# Altium footprint library Generic Footprint.PcbLib: 160 footprints (part 17 of 20) (continued)
## Symbol_FCC-Logo-9x6mm_Silkscreen [mm] (continued)
1(6.468,4.97) 1(6.478,4.164) 1(6.478,4.184) 1(6.478,4.939) 1(6.478,5.357) 1(6.478,5.378) 1(6.478,5.388) 1(6.488,4.174) 1(6.488,4.939) 1(6.498,2.073) 1(6.498,2.083) 1(6.498,2.093) 1(6.498,4.939) 1(6.509,1.277) 1(6.509,1.287) 1(6.509,1.298) 1(6.509,1.308) 1(6.509,4.949) 1(6.519,4.154) 1(6.519,4.164) 1(6.519,4.174) 1(6.519,4.939) 1(6.519,4.949) 1(6.519,4.959) 1(6.529,0.9) 1(6.529,2.083) 1(6.529,2.093) 1(6.529,2.103) 1(6.529,2.114) 1(6.539,0.084) 1(6.539,0.094) 1(6.539,2.093) 1(6.539,5.347) 1(6.539,5.378) 1(6.539,6.153) 1(6.539,6.163) 1(6.549,0.074) 1(6.549,4.154) 1(6.549,4.164) 1(6.549,5.367) 1(6.549,6.173) 1(6.56,1.308) 1(6.56,2.124) 1(6.56,4.133) 1(6.57,1.298) 1(6.57,1.318) 1(6.57,4.929) 1(6.58,4.154) 1(6.58,4.949) 1(6.58,5.357) 1(6.59,2.114) 1(6.59,2.134) 1(6.59,4.123) 1(6.59,4.133) 1(6.59,4.143) 1(6.59,5.357) 1(6.6,0.89) 1(6.6,2.114) 1(6.6,5.337) 1(6.611,1.308) 1(6.611,1.318) 1(6.611,1.328) 1(6.611,2.124) 1(6.611,2.144) 1(6.611,4.113) 1(6.611,4.123) 1(6.611,4.133) 1(6.611,4.929) 1(6.621,0.094) 1(6.621,0.104) 1(6.621,1.338) 1(6.621,4.919) 1(6.621,4.939) 1(6.621,6.143) 1(6.621,6.153) 1(6.621,6.163) 1(6.631,0.084) 1(6.631,0.114) 1(6.631,0.91) 1(6.631,2.124) 1(6.631,2.134) 1(6.631,4.103) 1(6.631,4.123) 1(6.631,4.908) 1(6.631,6.132) 1(6.641,0.114) 1(6.641,0.89) 1(6.641,0.9) 1(6.641,2.154) 1(6.651,0.114) 1(6.651,1.318) 1(6.651,1.328) 1(6.651,1.338) 1(6.651,2.134) 1(6.651,2.154) 1(6.651,4.092) 1(6.651,4.898) 1(6.651,4.919) 1(6.651,4.929) 1(6.651,5.347) 1(6.662,1.338) 1(6.662,1.349) 1(6.662,2.144) 1(6.662,2.165) 1(6.662,4.082) 1(6.662,4.103) 1(6.662,5.327) 1(6.662,5.347) 1(6.672,2.144) 1(6.672,2.154) 1(6.672,2.175) 1(6.672,4.103) 1(6.682,0.114) 1(6.682,0.9) 1(6.682,0.92) 1(6.682,1.328) 1(6.682,1.338) 1(6.682,2.165) 1(6.682,2.185) 1(6.682,4.092) 1(6.682,5.347) 1(6.682,6.153) 1(6.692,0.094) 1(6.692,0.104) 1(6.692,0.91) 1(6.692,1.349) 1(6.692,1.359) 1(6.692,2.165) 1(6.692,2.175) 1(6.692,4.072) 1(6.692,4.082) 1(6.692,4.092) 1(6.692,4.908) 1(6.692,5.337) 1(6.692,5.347) 1(6.692,6.122) 1(6.692,6.132) 1(6.692,6.143) 1(6.702,4.888) 1(6.702,4.898) 1(6.702,4.908) 1(6.702,4.919) 1(6.702,5.316) 1(6.713,2.175) 1(6.713,2.185) 1(6.713,2.195) 1(6.723,1.338) 1(6.723,1.359) 1(6.723,2.185) 1(6.723,4.062) 1(6.723,4.072) 1(6.723,4.082) 1(6.733,0.91) 1(6.733,0.92) 1(6.733,0.941) 1(6.733,2.205) 1(6.733,2.216) 1(6.733,4.878) 1(6.733,4.888) 1(6.733,5.337) 1(6.733,6.143) 1(6.743,0.104) 1(6.743,4.052) 1(6.743,4.062) 1(6.743,4.072) 1(6.743,4.898) 1(6.743,5.306) 1(6.743,5.316) 1(6.743,5.327) 1(6.743,6.122) 1(6.753,1.349) 1(6.753,2.226) 1(6.753,4.031) 1(6.753,4.041) 1(6.753,4.052) 1(6.753,4.062) 1(6.753,6.112) 1(6.764,4.041) 1(6.764,4.868) 1(6.764,4.878) 1(6.764,6.132) 1(6.774,0.92) 1(6.774,0.93) 1(6.774,0.941) 1(6.774,0.951) 1(6.774,2.236) 1(6.774,4.021) 1(6.774,4.041) 1(6.774,4.052) 1(6.784,2.236) 1(6.784,2.246) 1(6.784,4.011) 1(6.784,4.868) 1(6.784,4.888) 1(6.784,5.296) 1(6.784,5.306) 1(6.784,5.316) 1(6.784,5.327) 1(6.794,1.359) 1(6.804,0.114) 1(6.804,2.236) 1(6.804,6.102) 1(6.804,6.112) 1(6.815,0.941) 1(6.815,0.951) 1(6.815,0.961) 1(6.815,1.369) 1(6.815,2.246) 1(6.815,2.267) 1(6.815,4.001) 1(6.815,4.878) 1(6.815,6.102) 1(6.825,1.4) 1(6.825,2.246) 1(6.825,2.256) 1(6.825,2.267) 1(6.825,2.277) 1(6.825,3.98) 1(6.825,3.99) 1(6.825,5.286) 1(6.825,5.296) 1(6.825,5.306) 1(6.835,0.951) 1(6.835,1.379) 1(6.835,2.267) 1(6.835,2.277) 1(6.835,2.287) 1(6.835,3.99) 1(6.835,6.102) 1(6.835,6.122) 1(6.845,0.125) 1(6.845,0.145) 1(6.845,0.971) 1(6.845,1.389) 1(6.845,1.4) 1(6.845,1.41) 1(6.845,2.297) 1(6.845,3.97) 1(6.845,3.98) 1(6.845,6.102) 1(6.855,2.277) 1(6.855,3.99) 1(6.855,4.837) 1(6.855,4.857) 1(6.855,4.868) 1(6.855,5.276) 1(6.855,5.286) 1(6.855,5.296) 1(6.866,2.307) 1(6.866,3.96) 1(6.866,3.97) 1(6.866,3.98) 1(6.876,0.981) 1(6.876,1.4) 1(6.876,1.42) 1(6.876,2.318) 1(6.876,3.95) 1(6.876,3.96) 1(6.876,3.97) 1(6.876,4.827) 1(6.876,4.837) 1(6.876,4.847) 1(6.886,0.145) 1(6.886,1.41) 1(6.886,2.318) 1(6.886,2.328) 1(6.886,3.929) 1(6.886,3.939) 1(6.886,3.95) 1(6.886,3.96) 1(6.886,5.255) 1(6.886,5.265) 1(6.886,5.286) 1(6.896,0.135) 1(6.896,0.155) 1(6.896,0.165) 1(6.896,2.328) 1(6.896,2.338) 1(6.896,3.95) 1(6.896,4.817) 1(6.896,4.827) 1(6.896,6.112) 1(6.906,0.992) 1(6.906,1.41) 1(6.906,1.42) 1(6.906,1.43) 1(6.906,2.318) 1(6.906,2.348) 1(6.906,3.919) 1(6.906,4.806) 1(6.906,4.837) 1(6.917,0.981) 1(6.917,1.43) 1(6.917,2.328) 1(6.917,2.338) 1(6.917,2.348) 1(6.917,2.358) 1(6.917,3.909) 1(6.927,0.145) 1(6.927,0.981) 1(6.927,2.338) 1(6.927,2.358) 1(6.927,2.369) 1(6.927,3.899) 1(6.927,3.909) 1(6.927,3.919) 1(6.927,4.827) 1(6.927,5.245) 1(6.927,6.102) 1(6.937,0.155) 1(6.937,0.165) 1(6.937,0.176) 1(6.937,1.002) 1(6.937,1.42) 1(6.937,1.451) 1(6.937,2.348) 1(6.937,2.358) 1(6.937,2.369) 1(6.937,2.379) 1(6.937,3.888) 1(6.937,3.899) 1(6.937,3.919) 1(6.937,4.796) 1(6.937,4.806) 1(6.937,4.817) 1(6.937,6.071) 1(6.947,0.155) 1(6.947,0.165) 1(6.947,0.992) 1(6.947,1.43) 1(6.947,1.451) 1(6.947,2.389) 1(6.947,3.868) 1(6.947,3.878) 1(6.947,3.899) 1(6.947,3.909) 1(6.947,4.806) 1(6.947,5.235) 1(6.947,5.255) 1(6.947,6.092) 1(6.957,0.165) 1(6.957,2.369) 1(6.957,2.379) 1(6.957,2.389) 1(6.957,2.399) 1(6.957,2.409) 1(6.957,3.878) 1(6.957,3.888) 1(6.957,4.786) 1(6.957,4.796) 1(6.957,4.817) 1(6.957,5.255) 1(6.968,0.155) 1(6.968,1.44) 1(6.968,2.379) 1(6.968,2.389) 1(6.968,2.399) 1(6.968,2.42) 1(6.968,3.858) 1(6.968,3.868) 1(6.968,3.888) 1(6.978,0.155) 1(6.978,0.176) 1(6.978,0.992) 1(6.978,1.002) 1(6.978,1.012) 1(6.978,2.399) 1(6.978,2.409) 1(6.978,2.42) 1(6.978,2.43) 1(6.978,3.827) 1(6.978,3.837) 1(6.978,3.848) 1(6.978,3.868) 1(6.978,3.878) 1(6.978,4.776) 1(6.978,5.225) 1(6.978,5.245) 1(6.978,6.061) 1(6.978,6.071) 1(6.978,6.081) 1(6.988,0.165) 1(6.988,0.186) 1(6.988,1.451) 1(6.988,1.471) 1(6.988,2.409) 1(6.988,2.42) 1(6.988,2.43) 1(6.988,2.44) 1(6.988,3.817) 1(6.988,4.786) 1(6.998,1.002) 1(6.998,1.012) 1(6.998,1.022) 1(6.998,4.776) 1(6.998,4.796) 1(6.998,5.235) 1(6.998,5.245) 1(7.008,0.186) 1(7.008,0.196) 1(7.008,1.461) 1(7.008,1.471) 1(7.008,1.481) 1(7.008,3.807) 1(7.008,3.817) 1(7.008,6.051) 1(7.008,6.061) 1(7.008,6.071) 1(7.019,0.176) 1(7.019,1.012) 1(7.019,1.032) 1(7.019,1.491) 1(7.019,4.786) 1(7.019,5.214) 1(7.029,1.022) 1(7.029,1.032) 1(7.029,1.043) 1(7.029,1.471) 1(7.029,1.491) 1(7.029,3.766) 1(7.029,3.776) 1(7.029,3.817) 1(7.029,5.204) 1(7.029,5.225) 1(7.029,5.235) 1(7.039,1.032) 1(7.039,1.481) 1(7.039,1.502) 1(7.039,3.776) 1(7.039,3.797) 1(7.039,4.776) 1(7.039,5.214) 1(7.049,1.022) 1(7.049,1.053) 1(7.049,4.745) 1(7.049,5.194) 1(7.049,5.204) 1(7.049,5.225) 1(7.059,0.186) 1(7.059,0.196) 1(7.059,1.481) 1(7.059,1.491) 1(7.059,1.502) 1(7.059,1.512) 1(7.059,3.786) 1(7.059,4.735) 1(7.059,4.745) 1(7.059,4.755) 1(7.059,4.766) 1(7.059,5.214) 1(7.059,6.041) 1(7.059,6.051) 1(7.059,6.061) 1(7.07,0.186) 1(7.07,6.03) 1(7.08,0.186) 1(7.08,1.063) 1(7.08,1.512) 1(7.08,1.522) 1(7.08,4.725) 1(7.08,4.735) 1(7.08,4.745) 1(7.08,5.184) 1(7.08,5.194) 1(7.08,5.204) 1(7.09,1.502) 1(7.09,6.03) 1(7.09,6.041) 1(7.09,6.051) 1(7.1,1.053) 1(7.1,1.073) 1(7.1,1.522) 1(7.1,1.532) 1(7.1,4.715) 1(7.1,4.725) 1(7.1,4.735) 1(7.1,5.174) 1(7.1,5.194) 1(7.1,6.02) 1(7.11,1.053) 1(7.11,1.512) 1(7.11,1.532) 1(7.11,4.715) 1(7.11,4.725) 1(7.121,0.196) 1(7.121,1.063) 1(7.121,1.083) 1(7.121,4.694) 1(7.121,6.02) 1(7.121,6.041) 1(7.131,0.206) 1(7.131,1.522) 1(7.131,4.694) 1(7.131,4.715) 1(7.131,5.163) 1(7.141,1.063) 1(7.141,1.073) 1(7.141,1.083) 1(7.141,1.094) 1(7.141,1.532) 1(7.141,1.563) 1(7.141,4.684) 1(7.141,5.153) 1(7.141,6.01) 1(7.151,1.542) 1(7.151,4.704) 1(7.151,6.01) 1(7.151,6.03) 1(7.161,0.216) 1(7.161,0.237) 1(7.161,1.073) 1(7.161,1.094) 1(7.161,1.563) 1(7.161,4.684) 1(7.161,5.143) 1(7.172,1.083) 1(7.172,1.104) 1(7.172,1.553) 1(7.172,1.573) 1(7.172,4.674) 1(7.172,4.694) 1(7.182,0.247) 1(7.182,1.583) 1(7.182,4.664) 1(7.182,4.674) 1(7.182,5.133) 1(7.182,5.153) 1(7.192,0.227) 1(7.192,0.237) 1(7.192,1.094) 1(7.192,1.104) 1(7.192,1.114) 1(7.192,1.563) 1(7.192,1.573) 1(7.192,1.593) 1(7.192,4.664) 1(7.192,4.674) 1(7.192,4.684) 1(7.192,5.143) 1(7.192,5.153) 1(7.192,6.02) 1(7.202,1.573) 1(7.202,1.583) 1(7.202,1.604) 1(7.202,4.643) 1(7.202,5.123) 1(7.212,1.104) 1(7.212,1.114) 1(7.212,1.124) 1(7.212,1.583) 1(7.212,1.593) 1(7.212,1.604) 1(7.212,1.614) 1(7.212,5.133) 1(7.212,5.143) 1(7.212,5.979) 1(7.212,5.99) 1(7.212,6.01) 1(7.223,0.237) 1(7.223,0.247) 1(7.223,0.257) 1(7.223,4.633) 1(7.223,4.643) 1(7.223,4.653) 1(7.223,4.664) 1(7.233,0.267) 1(7.233,1.114) 1(7.233,1.124) 1(7.233,1.134) 1(7.233,1.145) 1(7.233,1.593) 1(7.233,1.614) 1(7.233,4.623) 1(7.233,4.633) 1(7.233,5.102) 1(7.233,5.123) 1(7.233,5.133) 1(7.243,0.247) 1(7.243,0.257) 1(7.243,1.124) 1(7.243,1.604) 1(7.243,1.624) 1(7.243,4.623) 1(7.243,4.643) 1(7.243,5.979) 1(7.243,5.99) 1(7.243,6) 1(7.253,0.267) 1(7.253,0.278) 1(7.253,1.624) 1(7.253,4.613) 1(7.253,4.633) 1(7.253,5.092) 1(7.253,5.102) 1(7.253,5.123) 1(7.253,5.969) 1(7.263,1.155) 1(7.263,1.614) 1(7.263,1.634) 1(7.263,4.613) 1(7.263,5.112) 1(7.263,5.99) 1(7.274,0.257) 1(7.274,0.278) 1(7.274,1.165) 1(7.274,1.624) 1(7.274,1.634) 1(7.274,1.644) 1(7.274,1.655) 1(7.274,4.623) 1(7.274,5.969) 1(7.284,0.288) 1(7.284,1.634) 1(7.284,1.644) 1(7.284,1.655) 1(7.284,1.665) 1(7.284,4.613) 1(7.284,5.082) 1(7.284,5.102) 1(7.284,5.959) 1(7.284,5.979) 1(7.294,0.267) 1(7.294,1.155) 1(7.294,1.644) 1(7.294,4.602) 1(7.294,5.072) 1(7.304,0.288) 1(7.304,1.165) 1(7.304,1.175) 1(7.304,1.655) 1(7.304,1.665) 1(7.304,1.675) 1(7.304,5.061) 1(7.304,5.949) 1(7.304,5.959) 1(7.304,5.969) 1(7.314,0.298) 1(7.314,1.155) 1(7.314,1.165) 1(7.314,1.185) 1(7.314,4.562) 1(7.314,4.572) 1(7.314,4.592) 1(7.325,1.175) 1(7.325,1.185) 1(7.325,1.196) 1(7.325,1.665) 1(7.325,1.675) 1(7.325,1.685) 1(7.325,4.551) 1(7.325,4.562) 1(7.325,4.572) 1(7.325,4.582) 1(7.335,0.278) 1(7.335,0.298) 1(7.335,1.675) 1(7.335,1.685) 1(7.335,4.551) 1(7.335,4.572) 1(7.335,5.041) 1(7.335,5.051) 1(7.335,5.061) 1(7.335,5.939) 1(7.335,5.949) 1(7.345,1.175) 1(7.345,1.185) 1(7.345,1.196) 1(7.345,1.206) 1(7.345,1.685) 1(7.345,4.531) 1(7.345,4.562) 1(7.345,5.051) 1(7.345,5.061) 1(7.345,5.959) 1(7.355,0.288) 1(7.355,1.695) 1(7.355,4.551) 1(7.355,5.939) 1(7.365,4.521) 1(7.365,5.031) 1(7.365,5.051) 1(7.376,0.298) 1(7.376,1.196) 1(7.376,1.206) 1(7.376,1.216) 1(7.376,1.226) 1(7.376,1.706) 1(7.376,4.521) 1(7.376,4.531) 1(7.376,4.541) 1(7.376,5.021) 1(7.376,5.031) 1(7.376,5.041) 1(7.376,5.949) 1(7.386,0.308) 1(7.386,0.329) 1(7.386,1.206) 1(7.386,1.216) 1(7.386,1.716) 1(7.386,4.531) 1(7.386,5.041) 1(7.386,5.939) 1(7.396,1.216) 1(7.396,1.236) 1(7.396,1.726) 1(7.396,4.521) 1(7.396,5.01) 1(7.396,5.031) 1(7.406,1.247) 1(7.406,1.757) 1(7.406,4.48) 1(7.406,4.49) 1(7.406,5) 1(7.416,0.318) 1(7.416,0.329) 1(7.416,0.339) 1(7.416,1.257) 1(7.416,1.736) 1(7.416,1.746) 1(7.416,1.757) 1(7.416,1.767) 1(7.416,4.47) 1(7.416,4.49) 1(7.416,4.5) 1(7.416,4.511) 1(7.416,4.99) 1(7.416,5.908) 1(7.416,5.928) 1(7.427,1.757) 1(7.427,1.767) 1(7.427,1.777) 1(7.427,4.46) 1(7.427,4.48) 1(7.427,4.49) 1(7.427,5.908) 1(7.437,0.329) 1(7.437,0.339) 1(7.437,0.349) 1(7.437,1.247) 1(7.437,1.267) 1(7.437,1.767) 1(7.437,1.777) 1(7.437,1.787) 1(7.437,4.449) 1(7.437,4.46) 1(7.437,4.47) 1(7.437,4.48) 1(7.437,4.98) 1(7.437,5.898) 1(7.437,5.918) 1(7.447,1.247) 1(7.447,1.257) 1(7.447,1.277) 1(7.447,1.777) 1(7.447,1.787) 1(7.447,2.43) 1(7.447,2.44) 1(7.447,2.45) 1(7.447,4.439) 1(7.447,4.449) 1(7.447,4.47) 1(7.447,4.97) 1(7.457,0.339) 1(7.457,0.349) 1(7.457,0.359) 1(7.457,1.257) 1(7.457,1.267) 1(7.457,4.429) 1(7.457,4.439) 1(7.457,4.46) 1(7.457,5.888) 1(7.457,5.898) 1(7.457,5.908) 1(7.467,0.369) 1(7.467,1.277) 1(7.467,1.287) 1(7.467,1.787) 1(7.467,1.797) 1(7.467,4.429) 1(7.467,4.449) 1(7.467,4.959) 1(7.467,5.877) 1(7.478,0.349) 1(7.478,0.369) 1(7.478,1.267) 1(7.478,1.277) 1(7.478,1.298) 1(7.478,1.808) 1(7.478,1.828) 1(7.478,4.439) 1(7.478,4.949) 1(7.478,5.898) 1(7.488,0.359) 1(7.488,0.38) 1(7.488,1.287) 1(7.488,1.308) 1(7.488,1.818) 1(7.488,1.828) 1(7.488,1.838) 1(7.488,4.398) 1(7.488,4.429) 1(7.488,4.939) 1(7.488,4.949) 1(7.488,4.959) 1(7.488,5.867) 1(7.488,5.877) 1(7.488,5.888) 1(7.498,0.359) 1(7.498,1.287) 1(7.498,1.298) 1(7.498,1.828) 1(7.498,1.838) 1(7.498,1.848) 1(7.498,1.859) 1(7.498,4.388) 1(7.498,4.419) 1(7.498,4.959) 1(7.498,5.888) 1(7.508,0.38) 1(7.508,0.39) 1(7.508,1.318) 1(7.508,1.848) 1(7.508,4.378) 1(7.508,4.398) 1(7.508,4.409) 1(7.508,4.929) 1(7.508,4.939) 1(7.508,4.949) 1(7.508,5.857) 1(7.508,5.867) 1(7.508,5.877) 1(7.518,0.369) 1(7.518,0.39) 1(7.518,1.298) 1(7.518,1.308) 1(7.518,1.838) 1(7.518,1.848) 1(7.518,1.859) 1(7.518,1.869) 1(7.518,1.879) 1(7.518,4.368) 1(7.518,4.388) 1(7.518,4.398) 1(7.518,4.919) 1(7.529,1.308) 1(7.529,1.328) 1(7.529,1.859) 1(7.529,1.869) 1(7.529,4.358) 1(7.529,4.378) 1(7.529,4.388) 1(7.529,4.908) 1(7.529,4.929) 1(7.529,4.939) 1(7.529,5.847) 1(7.529,5.857) 1(7.539,1.338) 1(7.539,1.349) 1(7.539,1.869) 1(7.539,1.879) 1(7.539,1.889) 1(7.539,1.899) 1(7.539,4.358) 1(7.539,4.368) 1(7.539,4.378) 1(7.539,4.898) 1(7.539,4.929) 1(7.539,5.867) 1(7.549,0.38) 1(7.549,1.338) 1(7.549,1.879) 1(7.549,1.889) 1(7.549,1.899) 1(7.549,4.368) 1(7.549,5.847) 1(7.559,1.359) 1(7.559,4.358) 1(7.559,4.888) 1(7.569,0.39) 1(7.569,0.41) 1(7.569,0.42) 1(7.569,1.338) 1(7.569,1.889) 1(7.569,1.899) 1(7.569,1.91) 1(7.569,1.93) 1(7.569,4.347) 1(7.569,4.878) 1(7.569,5.857) 1(7.58,1.369) 1(7.58,1.92) 1(7.58,1.93) 1(7.58,1.94) 1(7.58,1.95) 1(7.58,4.307) 1(7.58,4.327) 1(7.58,4.337) 1(7.58,4.868) 1(7.58,4.888) 1(7.59,0.4) 1(7.59,0.41) 1(7.59,0.42) 1(7.59,0.431) 1(7.59,1.369) 1(7.59,1.379) 1(7.59,1.93) 1(7.59,1.94) 1(7.59,1.961) 1(7.59,1.971) 1(7.59,4.276) 1(7.59,4.286) 1(7.59,4.307) 1(7.59,4.317) 1(7.59,4.878) 1(7.59,4.888) 1(7.59,5.847) 1(7.6,0.41) 1(7.6,1.369) 1(7.6,1.379) 1(7.6,1.389) 1(7.6,1.4) 1(7.6,1.94) 1(7.6,1.95) 1(7.6,1.961) 1(7.6,1.981) 1(7.6,4.286) 1(7.6,4.307) 1(7.6,4.857) 1(7.6,5.816) 1(7.6,5.837) 1(7.61,0.431) 1(7.61,1.379) 1(7.61,1.41) 1(7.61,1.95) 1(7.61,4.266) 1(7.61,4.296) 1(7.61,4.857) 1(7.61,4.878) 1(7.61,5.816) 1(7.62,0.42) 1(7.62,0.441) 1(7.62,1.961) 1(7.62,1.981) 1(7.62,1.991) 1(7.62,4.266) 1(7.62,4.286) 1(7.62,4.837) 1(7.62,4.847) 1(7.62,5.806) 1(7.62,5.826) 1(7.631,1.981) 1(7.631,1.991) 1(7.631,2.001) 1(7.631,2.012) 1(7.631,4.235) 1(7.631,4.266) 1(7.631,4.847) 1(7.631,4.857) 1(7.631,5.796) 1(7.631,5.806) 1(7.641,0.431) 1(7.641,0.441) 1(7.641,0.451) 1(7.641,1.42) 1(7.641,1.991) 1(7.641,2.001) 1(7.641,2.012) 1(7.641,4.235) 1(7.641,4.256) 1(7.641,4.827) 1(7.641,4.837) 1(7.641,4.847) 1(7.641,5.786) 1(7.641,5.796) 1(7.641,5.806) 1(7.641,5.816) 1(7.651,1.43) 1(7.651,2.001) 1(7.651,2.012) 1(7.651,2.022) 1(7.651,2.042) 1(7.651,4.205) 1(7.651,4.225) 1(7.651,4.235) 1(7.651,4.245) 1(7.651,4.806) 1(7.651,4.817) 1(7.651,4.827) 1(7.651,4.837) 1(7.651,5.775) 1(7.661,0.441) 1(7.661,0.451) 1(7.661,0.461) 1(7.661,1.44) 1(7.661,4.194) 1(7.661,4.796) 1(7.661,4.817) 1(7.661,4.827) 1(7.671,0.451) 1(7.671,0.461) 1(7.671,1.43) 1(7.671,1.44) 1(7.671,1.451) 1(7.671,2.032) 1(7.671,2.042) 1(7.671,2.063) 1(7.671,2.073) 1(7.671,4.184) 1(7.671,4.194) 1(7.671,4.205) 1(7.671,4.215) 1(7.671,4.786) 1(7.671,4.806) 1(7.671,4.817) 1(7.671,5.765) 1(7.671,5.786) 1(7.671,5.796) 1(7.682,1.43) 1(7.682,1.44) 1(7.682,1.451) 1(7.682,1.461) 1(7.682,2.042) 1(7.682,2.063) 1(7.682,2.083) 1(7.682,2.093) 1(7.682,4.154) 1(7.682,4.164) 1(7.682,4.174) 1(7.682,4.184) 1(7.682,4.205) 1(7.682,4.776) 1(7.682,4.796) 1(7.682,4.806) 1(7.682,5.775) 1(7.692,1.451) 1(7.692,1.461) 1(7.692,1.471) 1(7.692,2.052) 1(7.692,2.063) 1(7.692,2.073) 1(7.692,2.083) 1(7.692,2.093) 1(7.692,2.103) 1(7.692,4.143) 1(7.692,4.154) 1(7.692,4.164) 1(7.692,4.184) 1(7.692,4.194) 1(7.692,4.786) 1(7.692,4.796) 1(7.692,5.765) 1(7.692,5.786) 1(7.702,0.461) 1(7.702,1.461) 1(7.702,1.481) 1(7.702,2.073) 1(7.702,2.083) 1(7.702,2.093) 1(7.702,2.103) 1(7.702,2.114) 1(7.702,2.124) 1(7.702,4.123) 1(7.702,4.133) 1(7.702,4.154) 1(7.702,4.164) 1(7.702,4.766) 1(7.702,4.776) 1(7.702,4.786) 1(7.702,5.755) 1(7.702,5.775) 1(7.712,0.471) 1(7.712,1.491) 1(7.712,2.103) 1(7.712,4.745) 1(7.712,4.755) 1(7.712,4.766) 1(7.712,4.776) 1(7.712,5.755) 1(7.722,0.492) 1(7.722,1.502) 1(7.722,2.114) 1(7.722,2.124) 1(7.722,2.134) 1(7.722,2.144) 1(7.722,4.103) 1(7.722,4.113) 1(7.722,4.123) 1(7.722,4.735) 1(7.722,4.755) 1(7.722,4.766) 1(7.722,5.765) 1(7.733,0.482) 1(7.733,0.492) 1(7.733,0.502) 1(7.733,1.502) 1(7.733,1.512) 1(7.733,2.114) 1(7.733,2.124) 1(7.733,2.134) 1(7.733,2.144) 1(7.733,2.154) 1(7.733,4.082) 1(7.733,4.092) 1(7.733,4.103) 1(7.733,4.123) 1(7.733,4.745) 1(7.733,4.755) 1(7.743,0.492) 1(7.743,0.502) 1(7.743,0.512) 1(7.743,1.502) 1(7.743,1.512) 1(7.743,1.522) 1(7.743,2.134) 1(7.743,2.144) 1(7.743,4.082) 1(7.743,4.092) 1(7.743,4.725) 1(7.743,4.735) 1(7.743,4.745) 1(7.743,5.755) 1(7.753,0.522) 1(7.753,1.512) 1(7.753,1.522) 1(7.753,1.532) 1(7.753,2.216) 1(7.753,2.226) 1(7.753,4.082) 1(7.753,4.092) 1(7.753,4.103) 1(7.753,4.704) 1(7.753,4.715) 1(7.753,4.725) 1(7.753,4.735) 1(7.753,5.745) 1(7.763,1.532) 1(7.763,1.542) 1(7.763,2.165) 1(7.763,2.185) 1(7.763,4.021) 1(7.763,4.031) 1(7.763,4.062) 1(7.763,4.694) 1(7.763,4.715) 1(7.763,4.725) 1(7.763,5.714) 1(7.773,0.502) 1(7.773,0.512) 1(7.773,0.522) 1(7.773,0.533) 1(7.773,1.522) 1(7.773,1.542) 1(7.773,1.553) 1(7.773,2.175) 1(7.773,2.236) 1(7.773,4.011) 1(7.773,4.041) 1(7.773,4.072) 1(7.773,4.684) 1(7.773,4.704) 1(7.773,4.715) 1(7.773,5.735) 1(7.784,0.512) 1(7.784,0.533) 1(7.784,0.543) 1(7.784,1.532) 1(7.784,1.542) 1(7.784,1.553) 1(7.784,1.563) 1(7.784,2.195) 1(7.784,2.205) 1(7.784,2.246) 1(7.784,2.256) 1(7.784,3.98) 1(7.784,3.99) 1(7.784,4.001) 1(7.784,4.021) 1(7.784,4.052) 1(7.784,4.674) 1(7.784,4.694) 1(7.784,4.704) 1(7.784,5.704) 1(7.784,5.714) 1(7.784,5.724) 1(7.794,0.522) 1(7.794,1.553) 1(7.794,1.563) 1(7.794,1.573) 1(7.794,2.246) 1(7.794,2.256) 1(7.794,2.267) 1(7.794,2.277) 1(7.794,3.97) 1(7.794,3.99) 1(7.794,4.001) 1(7.794,4.021) 1(7.794,4.684) 1(7.794,4.694) 1(7.804,0.543) 1(7.804,0.553) 1(7.804,1.563) 1(7.804,1.583) 1(7.804,2.246) 1(7.804,2.256) 1(7.804,2.277) 1(7.804,2.297) 1(7.804,3.95) 1(7.804,3.97) 1(7.804,3.99) 1(7.804,4.001) 1(7.804,4.664) 1(7.804,4.674) 1(7.804,4.684) 1(7.804,5.694) 1(7.804,5.704) 1(7.804,5.714) 1(7.814,0.533) 1(7.814,1.593) 1(7.814,2.287) 1(7.814,2.297) 1(7.814,3.95) 1(7.814,3.96) 1(7.814,4.643) 1(7.814,4.653) 1(7.814,4.674) 1(7.814,5.684) 1(7.814,5.694) 1(7.814,5.704) 1(7.824,0.553) 1(7.824,1.604) 1(7.824,2.277) 1(7.824,3.97) 1(7.824,4.633) 1(7.824,4.653) 1(7.824,5.673) 1(7.835,0.543) 1(7.835,1.604) 1(7.835,1.614) 1(7.835,2.297) 1(7.835,2.307) 1(7.835,2.369) 1(7.835,2.379) 1(7.835,3.878) 1(7.835,3.929) 1(7.835,3.939) 1(7.835,3.95) 1(7.835,4.623) 1(7.835,4.643) 1(7.835,4.653) 1(7.835,5.684) 1(7.845,1.604) 1(7.845,1.614) 1(7.845,1.624) 1(7.845,2.318) 1(7.845,2.328) 1(7.845,2.338) 1(7.845,2.369) 1(7.845,2.379) 1(7.845,2.399) 1(7.845,3.848) 1(7.845,3.878) 1(7.845,3.919) 1(7.845,4.633) 1(7.845,4.643) 1(7.845,5.673) 1(7.845,5.684) 1(7.845,5.694) 1(7.855,0.553) 1(7.855,1.655) 1(7.855,2.348) 1(7.855,2.358) 1(7.855,2.369) 1(7.855,2.399) 1(7.855,2.409) 1(7.855,2.42) 1(7.855,3.807) 1(7.855,3.817) 1(7.855,3.827) 1(7.855,3.848) 1(7.855,3.878) 1(7.855,3.888) 1(7.855,3.899) 1(7.855,3.909) 1(7.855,4.613) 1(7.855,4.623) 1(7.855,4.633) 1(7.865,0.563) 1(7.865,1.614) 1(7.865,1.634) 1(7.865,1.644) 1(7.865,1.665) 1(7.865,2.379) 1(7.865,2.389) 1(7.865,2.43) 1(7.865,3.837) 1(7.865,3.858) 1(7.865,3.868) 1(7.865,4.602) 1(7.865,4.623) 1(7.875,0.573) 1(7.875,0.594) 1(7.875,1.655) 1(7.875,2.399) 1(7.875,2.42) 1(7.875,2.43) 1(7.875,3.786) 1(7.875,3.797) 1(7.875,3.817) 1(7.875,3.827) 1(7.875,3.848) 1(7.875,4.572) 1(7.875,4.582) 1(7.875,4.592) 1(7.875,5.673) 1(7.886,0.594) 1(7.886,0.604) 1(7.886,1.655) 1(7.886,1.675) 1(7.886,2.42) 1(7.886,2.43) 1(7.886,3.786) 1(7.886,3.797) 1(7.886,3.817) 1(7.886,3.827) 1(7.886,4.582) 1(7.886,5.643) 1(7.886,5.663) 1(7.896,0.584) 1(7.896,0.604) 1(7.896,1.685) 1(7.896,2.45) 1(7.896,3.786) 1(7.896,3.797) 1(7.896,4.562) 1(7.896,4.572) 1(7.896,4.582) 1(7.896,5.633) 1(7.896,5.643) 1(7.906,0.594) 1(7.906,0.614) 1(7.906,1.685) 1(7.906,1.716) 1(7.906,3.766) 1(7.906,4.541) 1(7.906,4.551) 1(7.906,4.572) 1(7.906,5.622) 1(7.906,5.633) 1(7.906,5.653) 1(7.916,0.624) 1(7.916,1.685) 1(7.916,1.726) 1(7.916,4.551) 1(7.916,5.612) 1(7.916,5.622) 1(7.916,5.633) 1(7.916,5.643) 1(7.926,0.604) 1(7.926,0.614) 1(7.926,0.635) 1(7.926,1.695) 1(7.926,1.716) 1(7.926,4.511) 1(7.926,4.521) 1(7.926,4.541) 1(7.926,4.551) 1(7.926,5.602) 1(7.926,5.612) 1(7.926,5.622) 1(7.937,0.614) 1(7.937,0.624) 1(7.937,0.635) 1(7.937,0.645) 1(7.937,1.706) 1(7.937,1.726) 1(7.937,1.736) 1(7.937,4.521) 1(7.937,4.541) 1(7.947,0.624) 1(7.947,1.716) 1(7.947,4.48) 1(7.947,4.49) 1(7.947,4.5) 1(7.947,4.521) 1(7.947,4.531) 1(7.947,5.592) 1(7.947,5.602) 1(7.957,0.645) 1(7.957,0.655) 1(7.957,4.47) 1(7.957,5.612) 1(7.967,0.635) 1(7.967,4.48) 1(7.967,5.582) 1(7.967,5.592) 1(7.967,5.602) 1(7.977,0.645) 1(7.977,0.655) 1(7.988,0.655) 1(7.988,5.582) 1(7.988,5.592) 1(7.998,0.686) 1(7.998,5.551) 1(7.998,5.582) 1(8.008,0.665) 1(8.008,0.686) 1(8.008,0.696) 1(8.008,5.571) 1(8.018,0.675) 1(8.018,5.551) 1(8.028,0.686) 1(8.028,0.696) 1(8.028,0.706) 1(8.028,5.531) 1(8.028,5.541) 1(8.028,5.561) 1(8.039,0.696) 1(8.039,0.706) 1(8.039,0.716) 1(8.039,5.531) 1(8.039,5.541) 1(8.039,5.551) 1(8.049,0.726) 1(8.049,5.541) 1(8.059,0.706) 1(8.059,0.716) 1(8.059,0.726) 1(8.059,5.5) 1(8.059,5.531) 1(8.069,0.716) 1(8.069,5.52) 1(8.079,0.726) 1(8.079,5.49) 1(8.079,5.5) 1(8.09,0.737) 1(8.09,5.51) 1(8.1,0.757) 1(8.1,5.49) 1(8.1,5.5) 1(8.11,0.757) 1(8.11,0.767) 1(8.11,5.49) 1(8.12,0.747) 1(8.12,0.767) 1(8.12,0.777) 1(8.12,5.459) 1(8.13,0.757) 1(8.13,0.777) 1(8.13,0.788) 1(8.13,5.449) 1(8.141,0.767) 1(8.141,0.777) 1(8.141,0.788) 1(8.141,0.798) 1(8.141,0.808) 1(8.141,5.439) 1(8.141,5.459) 1(8.141,5.469) 1(8.141,5.48) 1(8.151,0.788) 1(8.151,0.798) 1(8.151,5.429) 1(8.151,5.449) 1(8.151,5.459) 1(8.161,0.798) 1(8.161,0.808) 1(8.161,5.439) 1(8.161,5.449) 1(8.171,5.429) 1(8.171,5.439) 1(8.181,5.398) 1(8.181,5.429) 1(8.192,0.808) 1(8.192,5.398) 1(8.192,5.418) 1(8.202,0.818) 1(8.202,0.828) 1(8.202,0.849) 1(8.202,0.859) 1(8.202,5.408) 1(8.212,0.849) 1(8.212,5.398) 1(8.222,0.839) 1(8.222,0.859) 1(8.222,0.869) 1(8.232,0.849) 1(8.232,0.869) 1(8.232,0.879) 1(8.232,0.89) 1(8.232,5.357) 1(8.232,5.367) 1(8.243,0.859) 1(8.243,0.879) 1(8.243,0.9) 1(8.243,5.347) 1(8.243,5.367) 1(8.243,5.378) 1(8.243,5.388) 1(8.253,0.869) 1(8.253,0.879) 1(8.253,0.89) 1(8.253,5.337) 1(8.253,5.347) 1(8.253,5.357) 1(8.253,5.367) 1(8.263,0.89) 1(8.263,0.9) 1(8.263,0.91) 1(8.263,5.357) 1(8.273,0.91) 1(8.273,5.337) 1(8.273,5.347) 1(8.283,0.9) 1(8.294,0.91) 1(8.294,0.941) 1(8.294,5.296) 1(8.294,5.306) 1(8.294,5.337) 1(8.304,0.92) 1(8.304,0.93) 1(8.304,0.941) 1(8.304,0.951) 1(8.304,0.961) 1(8.304,5.286) 1(8.304,5.306) 1(8.304,5.316) 1(8.304,5.327) 1(8.314,0.951) 1(8.314,0.971) 1(8.314,5.276) 1(8.314,5.296) 1(8.314,5.306) 1(8.324,0.941) 1(8.324,0.961) 1(8.324,5.286) 1(8.324,5.296) 1(8.334,0.951) 1(8.334,0.971) 1(8.334,0.981) 1(8.334,5.255) 1(8.334,5.265) 1(8.334,5.276) 1(8.334,5.286) 1(8.345,0.961) 1(8.345,0.981) 1(8.345,0.992) 1(8.345,1.002) 1(8.345,5.245) 1(8.345,5.265) 1(8.345,5.276) 1(8.355,0.971) 1(8.355,0.981) 1(8.355,0.992) 1(8.355,5.235) 1(8.355,5.245) 1(8.355,5.255) 1(8.355,5.265) 1(8.365,1.002) 1(8.365,5.235) 1(8.365,5.255) 1(8.375,0.992) 1(8.375,5.245) 1(8.385,1.002) 1(8.385,1.032) 1(8.385,5.204) 1(8.385,5.214) 1(8.396,1.012) 1(8.396,1.032) 1(8.396,1.043) 1(8.396,1.053) 1(8.396,5.184) 1(8.396,5.194) 1(8.396,5.204) 1(8.396,5.214) 1(8.396,5.235) 1(8.406,1.022) 1(8.406,1.043) 1(8.406,1.063) 1(8.406,5.174) 1(8.406,5.184) 1(8.406,5.214) 1(8.406,5.225) 1(8.416,1.032) 1(8.416,1.053) 1(8.416,5.163) 1(8.416,5.204) 1(8.426,1.043) 1(8.426,1.063) 1(8.426,1.073) 1(8.426,5.153) 1(8.426,5.174) 1(8.426,5.184) 1(8.436,1.053) 1(8.436,1.073) 1(8.436,1.083) 1(8.436,5.143) 1(8.436,5.153) 1(8.436,5.163) 1(8.436,5.174) 1(8.447,1.063) 1(8.447,1.083) 1(8.447,5.133) 1(8.447,5.163) 1(8.457,1.073) 1(8.457,1.083) 1(8.457,5.133) 1(8.457,5.143) 1(8.457,5.153) 1(8.467,1.094) 1(8.467,1.104) 1(8.467,1.124) 1(8.467,5.112) 1(8.467,5.143) 1(8.477,1.124) 1(8.477,1.134) 1(8.477,5.102) 1(8.487,1.114) 1(8.487,1.134) 1(8.487,1.145) 1(8.487,5.082) 1(8.487,5.092) 1(8.487,5.112) 1(8.487,5.133) 1(8.498,1.124) 1(8.498,1.134) 1(8.498,1.145) 1(8.498,1.155) 1(8.498,1.165) 1(8.498,5.072) 1(8.498,5.082) 1(8.498,5.112) 1(8.498,5.123) 1(8.508,1.145) 1(8.508,1.155) 1(8.508,1.175) 1(8.508,5.061) 1(8.508,5.072) 1(8.518,1.155) 1(8.518,1.175) 1(8.518,5.051) 1(8.518,5.061) 1(8.518,5.082) 1(8.528,1.175) 1(8.528,5.041) 1(8.528,5.051) 1(8.528,5.072) 1(8.538,1.185) 1(8.538,1.206) 1(8.538,5.041) 1(8.538,5.061) 1(8.549,1.196) 1(8.549,1.206) 1(8.549,1.216) 1(8.549,5.021) 1(8.549,5.041) 1(8.549,5.051) 1(8.559,1.206) 1(8.559,1.216) 1(8.559,5) 1(8.559,5.01) 1(8.559,5.021) 1(8.559,5.031) 1(8.569,1.216) 1(8.569,1.226) 1(8.569,1.236) 1(8.569,1.257) 1(8.569,5) 1(8.569,5.01) 1(8.569,5.021) 1(8.579,4.98) 1(8.579,4.99) 1(8.579,5.01) 1(8.589,1.247) 1(8.589,1.257) 1(8.589,1.267) 1(8.589,1.277) 1(8.589,5) 1(8.6,1.257) 1(8.6,1.267) 1(8.6,1.277) 1(8.6,1.287) 1(8.6,1.298) 1(8.6,4.939) 1(8.6,4.949) 1(8.61,1.267) 1(8.61,1.277) 1(8.61,1.298) 1(8.61,1.308) 1(8.61,4.929) 1(8.61,4.949) 1(8.61,4.97) 1(8.62,1.318) 1(8.62,4.919) 1(8.62,4.929) 1(8.62,4.949) 1(8.62,4.959) 1(8.63,1.298) 1(8.63,1.308) 1(8.63,1.318) 1(8.63,4.919) 1(8.64,1.308) 1(8.64,1.338) 1(8.64,1.349) 1(8.64,4.898) 1(8.64,4.929) 1(8.651,1.318) 1(8.651,1.328) 1(8.651,1.338) 1(8.651,1.349) 1(8.651,1.359) 1(8.651,1.369) 1(8.651,4.868) 1(8.651,4.878) 1(8.651,4.888) 1(8.651,4.898) 1(8.651,4.919) 1(8.661,1.338) 1(8.661,1.359) 1(8.661,1.379) 1(8.661,4.857) 1(8.661,4.868) 1(8.661,4.878) 1(8.661,4.898) 1(8.661,4.908) 1(8.671,1.349) 1(8.671,1.359) 1(8.671,1.369) 1(8.671,1.379) 1(8.671,4.837) 1(8.671,4.847) 1(8.671,4.857) 1(8.681,1.369) 1(8.681,1.389) 1(8.681,1.4) 1(8.681,4.857) 1(8.681,4.868) 1(8.681,4.878) 1(8.691,1.379) 1(8.691,1.41) 1(8.691,1.42) 1(8.691,4.817) 1(8.691,4.827) 1(8.691,4.837) 1(8.691,4.847) 1(8.702,1.41) 1(8.702,1.42) 1(8.702,1.43) 1(8.702,4.796) 1(8.702,4.806) 1(8.702,4.817) 1(8.702,4.837) 1(8.702,4.847) 1(8.712,1.41) 1(8.712,1.42) 1(8.712,1.43) 1(8.712,4.796) 1(8.712,4.806) 1(8.722,1.43) 1(8.722,4.796) 1(8.722,4.806) 1(8.722,4.817) 1(8.732,1.44) 1(8.732,1.481) 1(8.732,1.746) 1(8.732,4.755) 1(8.742,1.451) 1(8.742,1.461) 1(8.742,1.481) 1(8.742,1.726) 1(8.742,1.757) 1(8.742,4.735) 1(8.742,4.745) 1(8.742,4.755) 1(8.742,4.786) 1(8.753,1.471) 1(8.753,1.502) 1(8.753,1.512) 1(8.753,1.522) 1(8.753,1.736) 1(8.753,4.715) 1(8.753,4.725) 1(8.753,4.735) 1(8.753,4.745) 1(8.753,4.755) 1(8.753,4.766) 1(8.753,4.776) 1(8.763,1.481) 1(8.763,1.491) 1(8.763,1.512) 1(8.763,1.532) 1(8.763,1.542) 1(8.763,4.694) 1(8.763,4.704) 1(8.763,4.715) 1(8.763,4.745) 1(8.773,1.542) 1(8.773,1.553) 1(8.773,1.563) 1(8.773,4.674) 1(8.773,4.684) 1(8.773,4.715) 1(8.773,4.735) 1(8.783,1.512) 1(8.783,4.694) 1(8.793,1.542) 1(8.793,1.563) 1(8.793,1.573) 1(8.793,4.664) 1(8.793,4.684) 1(8.793,4.694) 1(8.804,1.563) 1(8.804,1.573) 1(8.804,4.664) 1(8.804,4.684) 1(8.814,1.573) 1(8.814,1.583) 1(8.814,4.643) 1(8.814,4.653) 1(8.814,4.664) 1(8.824,1.593) 1(8.824,1.604) 1(8.824,1.644) 1(8.824,4.582) 1(8.824,4.592) 1(8.824,4.633) 1(8.834,1.614) 1(8.834,1.624) 1(8.834,1.655) 1(8.834,4.623) 1(8.844,1.644) 1(8.844,1.655) 1(8.844,1.665) 1(8.844,1.675) 1(8.844,4.551) 1(8.844,4.562) 1(8.844,4.572) 1(8.844,4.582) 1(8.844,4.602) 1(8.844,4.613) 1(8.855,1.634) 1(8.855,1.644) 1(8.855,1.655) 1(8.855,1.675) 1(8.855,1.685) 1(8.855,1.695) 1(8.855,1.706) 1(8.855,4.531) 1(8.855,4.541) 1(8.855,4.562) 1(8.855,4.582) 1(8.865,1.675) 1(8.865,1.685) 1(8.865,1.695) 1(8.865,1.716) 1(8.865,4.511) 1(8.865,4.521) 1(8.865,4.541) 1(8.865,4.562) 1(8.875,1.685) 1(8.875,1.695) 1(8.875,1.716) 1(8.875,4.5) 1(8.875,4.511) 1(8.875,4.521) 1(8.875,4.541) 1(8.885,4.5) 1(8.895,1.716) 1(8.895,1.726) 1(8.895,1.736) 1(8.895,4.5) 1(8.895,4.511) 1(8.895,4.521) 1(8.906,1.736) 1(8.906,1.746) 1(8.906,4.49) 1(8.916,1.757) 1(8.916,4.47)
Top Overlay:
  drawing of 4310 lines, arcs and shapes, not listed